# Altium footprint library CADTcommon.PcbLib: 503 footprints (part 4 of 32)
Each footprint in its own frame and in the unit in brackets; x right, y up, seen from the top. Pads: shape width x height; smd on the part's side, far side on the other; paste and mask are expansions set on the pad; w line width, h text height; cw(c..) or ccw(c..) is an arc to the next point about the centre after c.
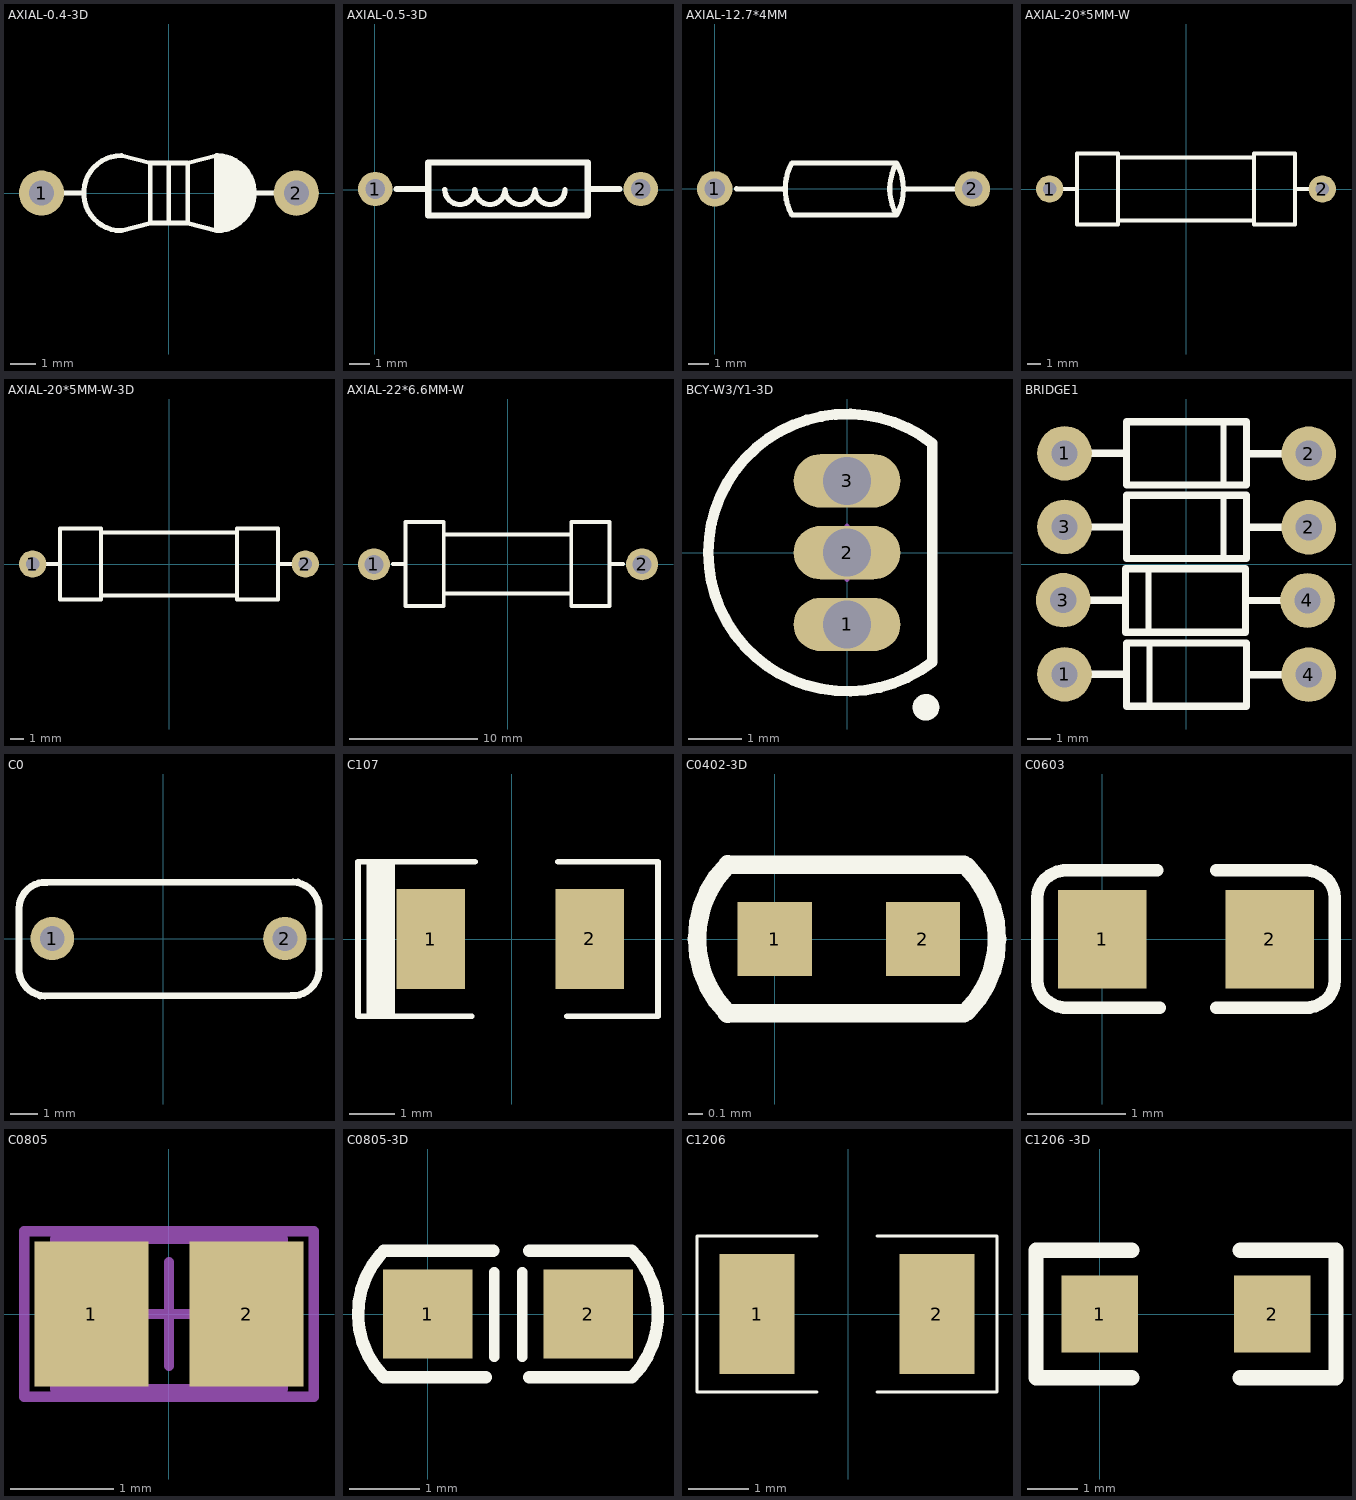
[diagram p3: the footprints below, top view; thin cyan lines are the x and y axes]

## AXIAL-0.4-3D [mm]
pads (2):
  round 1.8 hole 1: 1(-5.08,0)
  oval 1.8x1.81 hole 1: 2(5.08,0)
Top Overlay:
  lines w0.178: -1.9,-1.5 -0.75,-1.2 -0.75,1.2 -1.9,1.5 ; 0,-1.185 0,1.115 ; 0.75,-1.2 1.9,-1.5 ; 0.75,-1.1 0.75,1.2 1.9,1.5
  lines w0.2: -4.826,0 -3.5,0 ; -1.9,-1.5 cw(c-1.9,0) -1.9,1.5 ; -0.75,-1.2 0.75,-1.2 ; -0.75,1.2 0.75,1.2 ; 1.9,-1.5 ccw(c1.9,0) 1.9,1.5 ; 2.823,-1.041 2.823,0.959 ; 2.95,-0.991 2.95,0.889 ; 3.052,-0.813 3.052,0.716 ; 3.15,-0.563 3.15,0.58 ; 3.277,-0.432 3.277,0.33 ; 3.5,0 5,0
  lines w0.254: 1.93,-1.422 1.93,1.473 ; 2.134,-1.422 2.134,1.448 ; 2.362,-1.397 2.362,1.346 ; 2.54,-1.27 2.54,1.295 ; 2.718,-1.194 2.718,1.194
Bottom Overlay:
  lines w0.254: -5,0 -1.778,0 -1.524,1.016 -1.27,0 -1.016,-1.016 -0.787,0 -0.508,1.016 -0.254,0 0,-1.016 0.254,0 0.508,1.016 0.762,0 1.016,-1.016 1.27,0 5,0
3D body: height 3.12, standoff -2.06, extent -5.385,-1.118 5.334,1.118

## AXIAL-0.5-3D [mm]
pads (2):
  round 1.65 hole 0.95: 1(0.012,0.024) 2(12.712,0.024)
Top Overlay:
  lines w0.254: 3.342,0.001 ccw(c4.061,0.001) 4.779,0.001 ccw(c5.497,0.001) 6.216,0.001 ccw(c6.934,0.001) 7.653,0.001 ccw(c8.371,0.001) 9.09,0.001
  lines w0.305: 1.028,0.024 2.552,0.024 ; 10.172,0.024 11.696,0.024 ; 2.552,-1.246 10.172,-1.246 10.172,1.294 2.552,1.294 2.552,-1.246
3D body: height 0.5, standoff -4.1, extent -0.381,-1.422 13.081,1.435

## AXIAL-12.7*4MM [mm]
height 5
pads (2):
  round 1.75 hole 1: 1(0,0) 2(12.7,0)
Top Overlay:
  lines w0.254: 1.064,0.002 3.48,0 ; 9.322,-0.001 12.011,0.003 ; 8.963,1.282 ccw(c11.271,-0.004) 8.966,-1.295 ; 8.963,1.282 cw(c6.658,-0.01) 8.966,-1.295 ; 8.963,1.282 3.806,1.282 ccw(c6.115,-0.004) 3.81,-1.295 8.966,-1.295
3D body: height 3.6, standoff -1.8, extent -0.153,-1.626 12.948,1.574

## AXIAL-20*5MM-W [mm] "2W电阻"
height 10
pads (2):
  round 2 hole 1: 1(-10,0) 2(10,0)
Top Overlay:
  lines w0.3: -5,-2.6 -5,-2 -5,2 -5,2.6 ; -5,-2.3 5,-2.3 ; -5,2.3 5,2.3 ; 5,-2.6 5,-2 5,2 5,2.6
  lines w0.305: -8.983,0 -8,0 ; -5,-2.6 -8,-2.6 -8,2.6 -5,2.6 ; 5,-2.6 8,-2.6 8,2.6 5,2.6 ; 8,0 9.068,0
3D body: height 5.8, standoff -1.4, extent -10.425,-2.515 10.375,2.485

## AXIAL-20*5MM-W-3D [mm] "2W电阻"
height 10
pads (2):
  round 2 hole 1: 1(-10,0) 2(10,0)
Top Overlay:
  lines w0.3: -5,-2.6 -5,-2 -5,2 -5,2.6 ; -5,-2.3 5,-2.3 ; -5,2.3 5,2.3 ; 5,-2.6 5,-2 5,2 5,2.6
  lines w0.305: -8.983,0 -8,0 ; -5,-2.6 -8,-2.6 -8,2.6 -5,2.6 ; 5,-2.6 8,-2.6 8,2.6 5,2.6 ; 8,0 9.068,0
3D body: height 5.8, standoff -1.4, extent -10.425,-2.515 10.375,2.485

## AXIAL-22*6.6MM-W [mm] "2W电阻"
height 10
pads (2):
  round 2.5 hole 1.5: 1(-10.465,-0.025) 2(10.541,-0.025)
Top Overlay:
  lines w0.3: -5,-3.3 -5,3.3 ; -5,-2.6 -5,-2 ; -5,-2.3 5,-2.3 ; -5,2 -5,2.6 ; -5,2.3 5,2.3 ; 5,-3.3 5,3.3 ; 5,-2.6 5,-2 ; 5,2 5,2.6
  lines w0.305: -8.983,0 -8,0 ; -5,-3.3 -8,-3.3 -8,3.3 -5,3.3 ; 5,-3.3 8,-3.3 8,3.3 5,3.3 ; 8,0 9.068,0
3D body: height 8.3, standoff -2, extent -10.998,-3.249 11.202,3.351

## BCY-W3/Y1-3D [mm] "TO, Flat Index; 3 In-Line, Axial Leads; Body Dia. 5mm; Leads 0.55 x 0.50 mm (max)"
height 5.2
pads (3):
  oval 2x1 hole 0.9: 1(0,-1.346) 2(0,0) 3(0,1.346)
Top Overlay:
  circle w0.25: c1.48,-2.9 r0.125
  lines w0.2: 1.601,-2.049 cw(c0,0) 1.601,2.049 1.6,-2.049
Mechanical 13:
  lines w0.1: 1.601,-2.049 cw(c0,0) 1.601,2.049 1.6,-2.049
Mechanical 15:
  lines w0.1: -0.5,0 0.5,0 ; 0,-0.5 0,0.5
3D body: height 5.2, standoff 0, extent -2.612,-2.612 1.6,2.612

## BRIDGE1 [mm]
pads (8):
  round 2.3 hole 1.1: 1(-5.118,-4.648) 1(-5.118,4.661) 2(5.169,1.549) 2(5.169,4.648) 3(-5.169,-1.524) 3(-5.118,1.562) 4(5.118,-1.537) 4(5.169,-4.661)
Top Overlay:
  lines w0.254: -1.587,-2.87 -1.587,-0.203 ; -1.537,-5.994 -1.537,-3.327 ; 1.587,0.229 1.587,2.896 ; 1.587,3.327 1.587,5.994
  lines w0.305: -4.204,-1.524 -2.553,-1.524 ; -4.153,-4.648 -2.502,-4.648 ; -4.153,1.562 -2.502,1.562 ; -4.153,4.661 -2.502,4.661 ; 2.502,-1.537 4.153,-1.537 ; 2.553,-4.661 4.204,-4.661 ; 2.553,1.549 4.204,1.549 ; 2.553,4.648 4.204,4.648 ; -2.553,-2.87 -2.553,-0.203 2.502,-0.203 2.502,-2.87 -2.553,-2.87 ; -2.502,-5.994 -2.502,-3.327 2.553,-3.327 2.553,-5.994 -2.502,-5.994 ; -2.502,0.229 -2.502,2.896 2.553,2.896 2.553,0.229 -2.502,0.229 ; -2.502,3.327 2.553,3.327 2.553,5.994 -2.502,5.994 -2.502,3.327
3D body: height 2.55, standoff -2.54, extent -5.372,-5.944 5.55,-3.378
3D body: height 2.55, standoff -2.54, extent -5.486,0.279 5.436,2.845
3D body: height 2.55, standoff -2.54, extent -5.486,3.378 5.436,5.944
3D body: height 2.55, standoff -2.54, extent -5.423,-2.819 5.499,-0.254

## C0 [mil]
pads (2):
  round 62 hole 35.43: 1(-158,0) 2(174,0)
Top Overlay:
  lines w10: -175.47,-81.69 189.54,-81.65 ; -172.47,80.27 192.53,80.32 ; -168.47,-81.69 cw(c-167.46,-43.69) -205.43,-41.69 -205.47,43.31 cw(c-167.47,42.31) -165.47,80.27 ; 182.54,-81.65 ccw(c184.53,-43.69) 222.54,-44.69 222.53,40.31 ; 185.54,80.31 cw(c184.53,42.31) 222.5,40.31
3D body: height 449.69, standoff -98.43, extent -242.01,-95.52 259.96,91.52

## C107 [mm] "107P"
pads (2):
  rect 1.5x2.2 smd: 1(-1.778,0) 2(1.722,0)
Top Overlay:
  lines w0.127: -3.127,-1.7 -3.127,1.7 ; -3.003,-1.675 -3.003,1.7 ; -2.877,-1.7 -2.877,1.7 ; -2.753,-1.65 -2.753,1.7 ; -2.628,-1.7 -2.628,1.7 ; -0.877,-1.7 -3.377,-1.7 -3.377,1.7 -0.802,1.7 ; 1.022,1.7 3.222,1.7 3.222,-1.7 1.222,-1.7

## C0402-3D [mil]
pads (2):
  rect 20x20 smd: 1(0,0) 2(40,0)
Top Overlay:
  lines w5: -13,-20 51,-20 ; -12.65,-20.15 cw(c7.5,0) -12.65,20.15 ; -12,20 51,20 ; 51.95,-19.45 ccw(c32.5,0) 51.95,19.45
3D body: height 7.95, standoff 0, extent 1,-11.81 40.37,11.81

## C0603 [mm]
pads (2):
  rect 0.9x1 smd: 1(0,0) 2(1.7,0)
Top Overlay:
  lines w0.127: -0.391,-0.696 -0.127,-0.696 ; -0.391,0.7 0.559,0.7 ; -0.366,-0.697 0.584,-0.697 ; -0.366,-0.696 cw(c-0.366,-0.387) -0.584,-0.606 cw(c-0.4,-0.422) -0.66,-0.422 -0.66,0.426 cw(c-0.4,0.426) -0.584,0.61 cw(c-0.366,0.391) -0.366,0.7 ; 1.158,-0.697 2.108,-0.697 ; 1.158,0.7 2.108,0.7 ; 2.068,-0.696 ccw(c2.068,-0.387) 2.286,-0.606 ccw(c2.102,-0.422) 2.362,-0.422 2.362,0.426 ccw(c2.102,0.426) 2.286,0.61 ccw(c2.068,0.391) 2.068,0.7
3D body: height 0.3, standoff 0, extent 0.089,-0.4 1.689,0.4

## C0805 [mm] "Chip Capacitor, Body 2.0x1.3mm, IPC High Density"
height 1.4
pads (2):
  rect 1.1x1.4 smd: 1(-0.75,0) 2(0.75,0)
Mechanical 13:
  lines w0.1: -1.1,-0.725 1.1,-0.725 1.1,0.725 -1.1,0.725 -1.1,-0.725
Mechanical 15:
  lines w0.1: -0.5,0 0.5,0 ; 0,-0.5 0,0.5 ; -1.4,-0.8 1.4,-0.8 1.4,0.8 -1.4,0.8 -1.4,-0.8
3D body: height 1.4, standoff 0, extent -1.1,-0.725 1.1,0.725

## C0805-3D [mil]
pads (2):
  rect 50x50 smd: 1(0,0) 2(90,0)
Top Overlay:
  lines w5.91: 37.25,-23.83 37.25,23.41 ; 53,-23.83 53,23.41
  lines w7: -26.39,33.35 ccw(c11.26,0) -25.09,-34.77 ; -24.64,-35.43 32.48,-35.43 ; -24.64,35.43 36.61,35.43 ; 56.82,-35.43 114.17,-35.43 ; 56.82,35.43 114.17,35.43 ; 114.31,-35.57 ccw(c78.74,0) 114.31,35.57
3D body: height 47.24, standoff 0, extent 6,-24 84.74,23.24

## C1206 [mm]
pads (2):
  rect 1.25x2 smd: 1(-1.524,0) 2(1.476,0)
Top Overlay:
  lines w0.05: -0.524,-1.3 -2.524,-1.3 -2.524,1.3 -0.524,1.3 ; 0.476,-1.3 2.476,-1.3 2.476,1.3 0.476,1.3

## C1206 -3D [mil]
pads (2):
  rect 60x60 smd: 1(0,0) 2(135,0)
Top Overlay:
  lines w12: 25,-50 -50,-50 -50,50 25,50 ; 110,-50 185,-50 185,50 110,50
3D body: height 62.99, standoff 0, extent 5,-32 130.98,30.99